# Altium footprint library INPUT_PCB_LIBRARY.PcbLib: 58 footprints (part 2 of 4)
Each footprint in its own frame and in the unit in brackets; x right, y up, seen from the top. Pads: shape width x height; smd on the part's side, far side on the other; paste and mask are expansions set on the pad; w line width, h text height; cw(c..) or ccw(c..) is an arc to the next point about the centre after c.
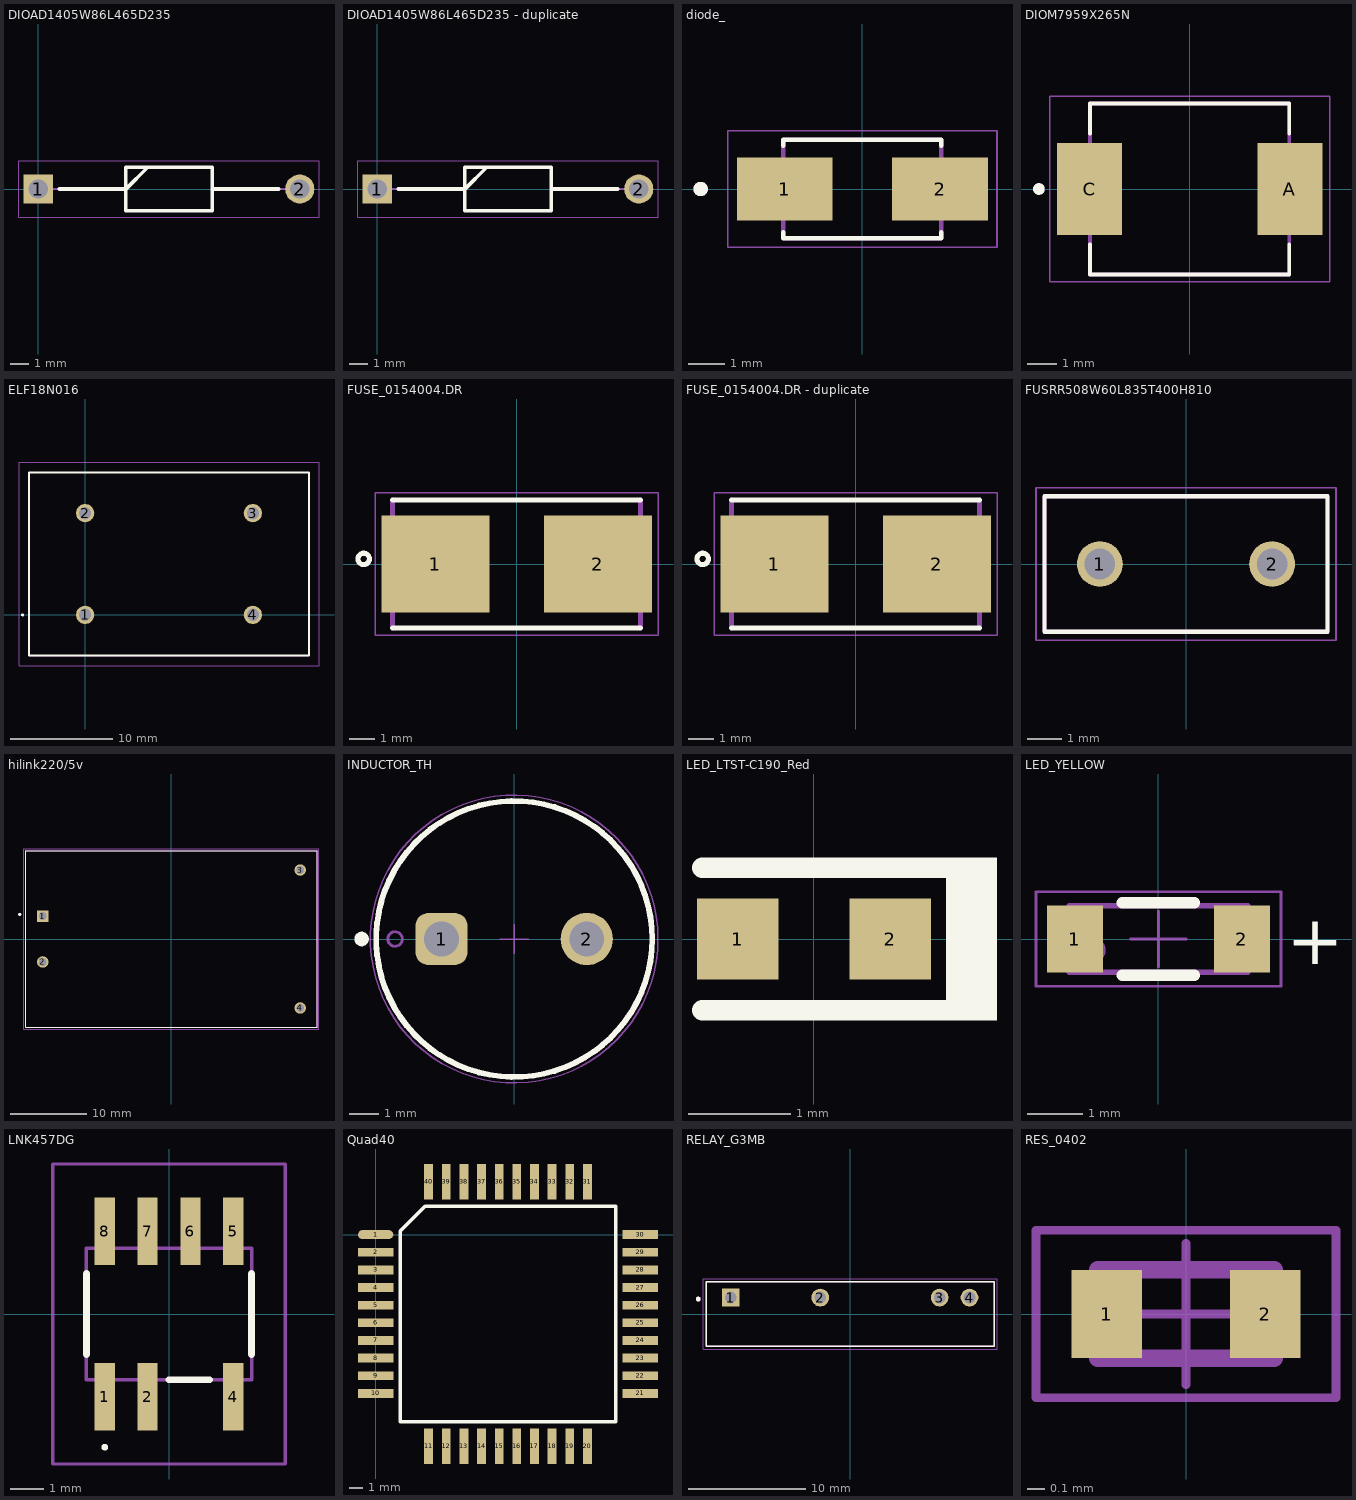
[diagram p1: the footprints below, top view; thin cyan lines are the x and y axes]

## DIOAD1405W86L465D235 [mm]
pads (2):
  rect 1.575x1.575 / inner round 1.575 / far side rect 1.575x1.575 hole 1.05: 1(0,0)
  round 1.575 hole 1.05: 2(14.1,0)
Top Overlay:
  lines w0.2: 1.138,0 4.725,0 5.9,1.175 ; 9.375,0 12.962,0 ; 4.725,-1.175 9.375,-1.175 9.375,1.175 4.725,1.175 4.725,-1.175
Mechanical 15:
  lines w0.1: 0,0 4.725,0 5.9,1.175 ; 9.375,0 14.1,0 ; 4.725,-1.175 9.375,-1.175 9.375,1.175 4.725,1.175 4.725,-1.175
Mechanical 20:
  lines w0.05: -1.038,-1.525 15.137,-1.525 15.137,1.525 -1.038,1.525 -1.038,-1.525
3D body "1N4006-E3_54.stp": height 5.8, standoff -4.65, extent -10,-3.376 10,3.376

## DIOAD1405W86L465D235 - duplicate [mm]
pads (2):
  rect 1.575x1.575 / inner round 1.575 / far side rect 1.575x1.575 hole 1.05: 1(0,0)
  round 1.575 hole 1.05: 2(14.1,0)
Top Overlay:
  lines w0.2: 1.138,0 4.725,0 5.9,1.175 ; 9.375,0 12.962,0 ; 4.725,-1.175 9.375,-1.175 9.375,1.175 4.725,1.175 4.725,-1.175
Mechanical 15:
  lines w0.1: 0,0 4.725,0 5.9,1.175 ; 9.375,0 14.1,0 ; 4.725,-1.175 9.375,-1.175 9.375,1.175 4.725,1.175 4.725,-1.175
Mechanical 20:
  lines w0.05: -1.038,-1.525 15.137,-1.525 15.137,1.525 -1.038,1.525 -1.038,-1.525
3D body "1N4933G.stp": height 5.8, standoff -4.65, extent -10,-3.376 10,3.376

## diode_ [mm]
height 2.5
pads (2):
  rect 2.65x1.75 smd: 1(-2.15,0) 2(2.15,0)
Top Overlay:
  circle w0.2: c-4.475,0 r0.1
  lines w0.127: -2.187,-1.195 -2.187,-1.362 2.187,-1.362 2.187,-1.195 ; -2.187,1.195 -2.187,1.362 2.187,1.362 2.187,1.195
Mechanical 13:
  circle w0.2: c-4.475,0 r0.1
  lines w0.127: -2.187,-1.362 2.187,-1.362 2.187,1.362 -2.187,1.362 -2.187,-1.362
Mechanical 15:
  lines w0.05: -3.725,-1.613 3.725,-1.613 3.725,1.613 -3.725,1.613 -3.725,-1.613
3D body "step_temp.STEP": height 2.7, standoff 0, extent -2.6,-1.362 2.6,1.362

## DIOM7959X265N [mm]
height 2.65
pads (2):
  rect 2.25x3.18 smd: A(3.455,0) C(-3.455,0)
Top Overlay:
  circle w0.2: c-5.2,0 r0.1
  lines w0.127: -3.437,-1.91 -3.437,-2.95 3.437,-2.95 3.437,-1.91 ; -3.437,1.91 -3.437,2.95 3.437,2.95 3.437,1.91
Mechanical 13:
  circle w0.2: c-5.2,0 r0.1
  lines w0.127: -3.437,-2.95 -3.437,2.95 3.437,2.95 3.437,-2.95 -3.437,-2.95
Mechanical 15:
  lines w0.05: -4.83,-3.2 4.83,-3.2 4.83,3.2 -4.83,3.2 -4.83,-3.2
3D body "step_temp.STEP": height 1.2, standoff -1.41, extent -3.975,-2.95 3.975,2.95

## ELF18N016 [mm]
pads (4):
  round 1.8 hole 1.2: 1(0,0) 2(0,10) 3(16.5,10) 4(16.5,0)
Top Overlay:
  lines w0.2: -6.2,0 cw(c-6.15,0) -6.1,0 ; -6.2,0 ccw(c-6.15,0) -6.1,0 ; -6.2,0 cw(c-6.15,0) -6.1,0 ; -5.5,-4 -5.5,14 22,14 22,-4 -5.5,-4
Mechanical 13:
  lines w0.1: -5.5,-4 -5.5,14 22,14 22,-4 -5.5,-4
Mechanical 15:
  lines w0.1: -6.5,-5 -6.5,15 23,15 23,-5 -6.5,-5
3D body "ELF-18N016.stp": height 27.6, standoff -5, extent -5.5,-4 22,14

## FUSE_0154004.DR [mm]
pads (2):
  rect 4.24x3.81 smd: 1(-3.19,0) 2(3.19,0)
Top Overlay:
  circle w0.2: c-6,0.2 r0.224
  lines w0.2: -4.863,-2.515 4.863,-2.515 ; -4.863,2.515 4.863,2.515
Mechanical 13:
  lines w0.2: -4.863,-2.515 -4.863,2.515 ; 4.863,-2.515 4.863,2.515
Mechanical 15:
  lines w0.05: -5.55,-2.8 5.55,-2.8 5.55,2.8 -5.55,2.8 -5.55,-2.8
3D body "0154004.DR--3DModel-STEP-56544.STEP": height 3.81, standoff 0, extent -4.992,-3.125 4.738,1.905

## FUSE_0154004.DR - duplicate [mm]
pads (2):
  rect 4.24x3.81 smd: 1(-3.19,0) 2(3.19,0)
Top Overlay:
  circle w0.2: c-6,0.2 r0.224
  lines w0.2: -4.863,-2.515 4.863,-2.515 ; -4.863,2.515 4.863,2.515
Mechanical 13:
  lines w0.2: -4.863,-2.515 -4.863,2.515 ; 4.863,-2.515 4.863,2.515
Mechanical 15:
  lines w0.05: -5.55,-2.8 5.55,-2.8 5.55,2.8 -5.55,2.8 -5.55,-2.8
3D body "0154004.DR--3DModel-STEP-56544.STEP": height 3.81, standoff 0, extent -4.992,-3.125 4.738,1.905

## FUSRR508W60L835T400H810 [mm]
pads (2):
  round 1.35 hole 0.9: 1(-2.54,0) 2(2.54,0)
Top Overlay:
  lines w0.127: -4.175,-2 -4.175,2 4.175,2 4.175,-2 -4.175,-2
Mechanical 13:
  lines w0.127: -4.175,-2 4.175,-2 4.175,2 -4.175,2 -4.175,-2
Mechanical 15:
  lines w0.05: -4.425,-2.25 -4.425,2.25 4.425,2.25 4.425,-2.25 -4.425,-2.25

## hilink220/5v [mm]
pads (4):
  rect 1.5x1.5 / inner round 1.5 / far side rect 1.5x1.5 hole 1: 1(-16.8,3)
  round 1.5 hole 1: 2(-16.8,-3) 3(16.8,9) 4(16.8,-9)
Top Overlay:
  circle w0.2: c-19.8,3.2 r0.1
  lines w0.127: -19,-11.5 19,-11.5 19,11.5 -19,11.5 -19,-11.5
Mechanical 13:
  circle w0.2: c-19.8,3.2 r0.1
  lines w0.127: -19,-11.5 -19,11.5 19,11.5 19,-11.5 -19,-11.5
Mechanical 15:
  lines w0.05: -19.25,-11.75 -19.25,11.75 19.25,11.75 19.25,-11.75 -19.25,-11.75
3D body "step_temp.STEP": height 23, standoff 0, extent -19,-11.5 19,11.5

## INDUCTOR_TH [mm] "Radial Leaded Wire Wound Inductor, body diameter 9.5mm"
height 8
pads (2):
  rrect50% 1.8x1.8 hole 1.2: 1(-2.5,0)
  round 1.8 hole 1.2: 2(2.5,0)
Top Overlay:
  circle w0.2: c0,0 r4.75
  circle w0.25: c-5.25,0 r0.125
Top Courtyard:
  circle w0.05: c0,0 r4.95
  lines w0.05: -0.5,0 0.5,0 ; 0,-0.5 0,0.5
Top Designator:
  text ".Designator" at -7.498,-0.5 h1.5
Top 3D Body:
  circle w0.1: c0,0 r4.75
  circle w0.1: c-4.1,0 r0.25
Top Component Outline:
  circle w0.1: c0,0 r4.75
  circle w0.1: c-4.1,0 r0.25
3D body "STEP-WE-TI-8075_HST-rev1.stp": height 7.75, standoff -4.95, extent -4.1,-4.1 4.1,4.1

## LED_LTST-C190_Red [mm]
pads (2):
  rect 0.8x0.8 smd: 1(-0.75,0) 2(0.75,0)
Top Overlay:
  region: 1.8,0.8 1.3,0.8 1.3,-0.8 1.8,-0.8
  lines w0.2: -1.1,-0.7 1.4,-0.7 ; -1.1,0.7 1.4,0.7
Top 3D Body:
  region: 1.8,0.75 1.3,0.75 1.3,-0.75 1.8,-0.75
  lines w0.1: -1.1,-0.7 1.4,-0.7 ; -1.1,0.7 1.4,0.7
  text ".Designator" at -1.2,-0.3 h0.64
3D body "Lite-On_LTST_C190_red.stp": height 0.9, standoff 0, extent -0.85,-0.45 0.85,0.45

## LED_YELLOW [mm] "SMD Mono-color Reverse mount Waterclear, body 3.2x1.2mm"
height 1.2
pads (2):
  rect 1x1.2 smd: 1(-1.5,0) 2(1.5,0)
Top Overlay:
  lines w0.2: -0.65,-0.65 0.65,-0.65 ; -0.65,0.65 0.65,0.65
  text "+" at 2.3,-0.45 h0.89
Top Courtyard:
  lines w0.05: -0.5,0 0.5,0 ; 0,-0.5 0,0.5 ; -2.2,-0.85 -2.2,0.85 2.2,0.85 2.2,-0.85 -2.2,-0.85
Top Designator:
  text ".Designator" at -4.998,-0.333 h1
Top Component Outline:
  circle w0.1: c-1.2,-0.2 r0.2
  lines w0.1: -1.6,-0.6 1.6,-0.6 1.6,0.6 -1.6,0.6 -1.6,-0.6
3D body "WE-SMRW_1205_rectangular.stp": height 1.1, standoff 0, extent -1.6,-0.6 1.6,0.6

## LNK457DG [mm]
pads (7):
  rect 0.6x2 smd: 1(-1.905,-2.45) 2(-0.635,-2.45) 4(1.905,-2.45) 5(1.905,2.45) 6(0.635,2.45) 7(-0.635,2.45) 8(-1.905,2.45)
Top Overlay:
  lines w0.1: -1.905,-4 cw(c-1.905,-3.95) -1.905,-3.9 cw(c-1.905,-3.95) -1.905,-4
  lines w0.2: -2.45,-1.2 -2.45,1.2 ; 0,-1.95 1.2,-1.95 ; 2.45,-1.2 2.45,1.2
Mechanical 15:
  lines w0.1: -2.45,-1.95 -2.45,1.95 2.45,1.95 2.45,-1.95 -2.45,-1.95
Mechanical 20:
  lines w0.1: -3.45,-4.45 -3.45,4.45 3.45,4.45 3.45,-4.45 -3.45,-4.45
3D body "LNK457DG.stp": height 5.8, standoff -4.65, extent -10,-3.376 10,3.376

## Quad40 [mm]
pads (40):
  oval 2.54x0.635 smd: 1(0,0)
  rect 2.54x0.635 smd: 2(0,-1.27) 3(0,-2.54) 4(0,-3.81) 5(0,-5.08) 6(0,-6.35) 7(0,-7.62) 8(0,-8.89) 9(0,-10.16) 10(0,-11.43) 21(19.05,-11.43) 22(19.05,-10.16) 23(19.05,-8.89) 24(19.05,-7.62) 25(19.05,-6.35) 26(19.05,-5.08) 27(19.05,-3.81) 28(19.05,-2.54) 29(19.05,-1.27) 30(19.05,0)
  rect 0.635x2.54 smd: 11(3.81,-15.24) 12(5.08,-15.24) 13(6.35,-15.24) 14(7.62,-15.24) 15(8.89,-15.24) 16(10.16,-15.24) 17(11.43,-15.24) 18(12.7,-15.24) 19(13.97,-15.24) 20(15.24,-15.24) 31(15.24,3.81) 32(13.97,3.81) 33(12.7,3.81) 34(11.43,3.81) 35(10.16,3.81) 36(8.89,3.81) 37(7.62,3.81) 38(6.35,3.81) 39(5.08,3.81) 40(3.81,3.81)
Top Overlay:
  lines w0.254: 1.778,-13.462 17.272,-13.462 17.272,2.032 3.556,2.032 1.778,0.254 1.778,-13.462
3D body: height 0.63, standoff -0.63, extent 1.778,-13.271 17.018,1.968

## RELAY_G3MB [mm]
pads (4):
  rect 1.508x1.508 hole 1: 1(-10.16,1.4)
  round 1.508 hole 1: 2(-2.54,1.4) 3(7.62,1.4) 4(10.16,1.4)
Top Overlay:
  circle w0.2: c-12.93,1.27 r0.1
  lines w0.127: -12.25,-2.75 12.25,-2.75 12.25,2.75 -12.25,2.75 -12.25,-2.75
Mechanical 13:
  circle w0.2: c-12.93,1.27 r0.1
  lines w0.127: -12.25,-2.75 12.25,-2.75 12.25,2.75 -12.25,2.75 -12.25,-2.75
Mechanical 15:
  lines w0.05: -12.5,-3 -12.5,3 12.5,3 12.5,-3 -12.5,-3
3D body "G3MB-202P.STEP": height 20.5, standoff -3.9, extent -12.377,-2.75 12.123,2.75

## RES_0402 [mm] "Thick Film Resistors, SMT, body size 1x0.5mm"
height 0.35
pads (2):
  rect 0.4x0.5 smd: 1(-0.45,0) 2(0.45,0)
Top Courtyard:
  lines w0.05: -0.4,0 0.4,0 ; 0,-0.4 0,0.4 ; -0.85,-0.475 0.85,-0.475 0.85,0.475 -0.85,0.475 -0.85,-0.475
Top Designator:
  text ".Designator" at -2.499,-0.167 h0.5
Top Component Outline:
  lines w0.1: -0.5,-0.25 0.5,-0.25 0.5,0.25 -0.5,0.25 -0.5,-0.25
3D body "WRIS-KSKE_0402.stp": height 0.35, standoff 0, extent -0.5,-0.25 0.5,0.25